# Altium schematic symbol library Minh_Lib.SchLib: 619 symbols (part 2 of 4) (continued)
## DS3231SN# (continued)
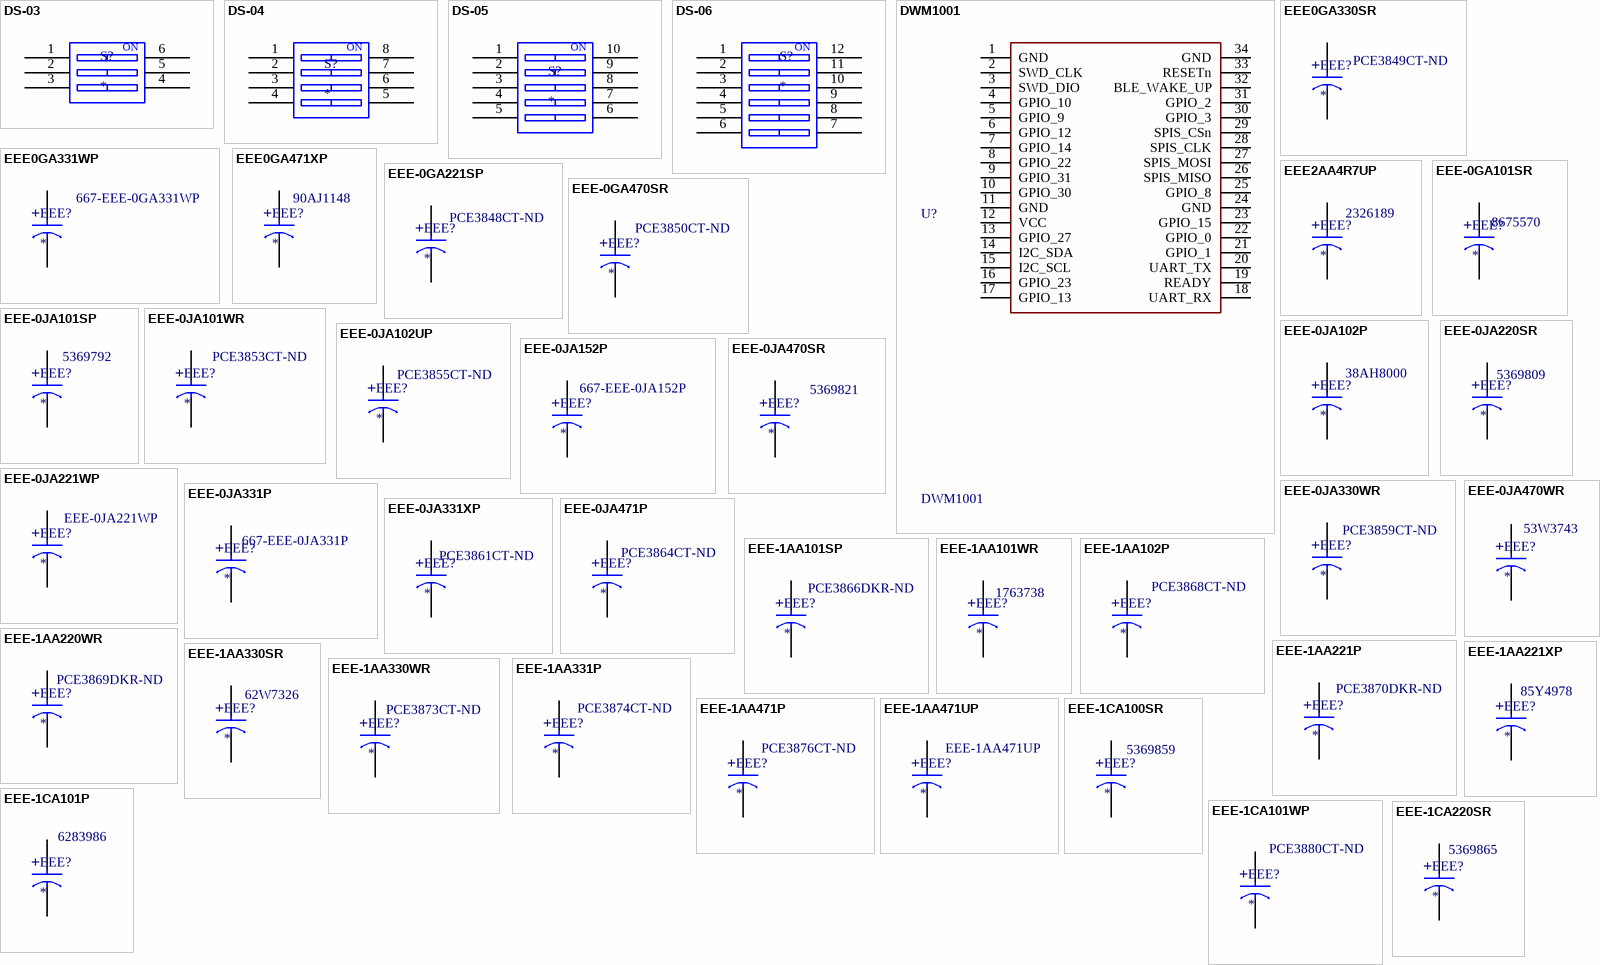
[diagram p7: symbols DS-03 to EEE-1CA220SR]

## DS-03
designator S?
footprint DS-03 (Dip Switch  - 3P)
pins: 1, 2, 3, 4, 5, 6
text: ON

## DS-04
designator S?
footprint DS-04 (Dip Switch  - 4P)
pins: 1, 2, 3, 4, 5, 6, 7, 8
text: ON

## DS-05
designator S?
footprint DS-05 (Dip Switch  - 5P)
pins: 1, 2, 3, 4, 5, 6, 7, 8, 9, 10
text: ON

## DS-06
designator S?
footprint DS-06
pins: 1, 2, 3, 4, 5, 6, 7, 8, 9, 10, 11, 12
text: ON

## DWM1001
designator U?
Local Supplier: x; Local Supplier Part Number: x; Local Supplier Link: x
footprint DWM1001 (DWM1001 MODULE)
pins: 1 GND, 2 SWD_CLK, 3 SWD_DIO, 4 GPIO_10, 5 GPIO_9, 6 GPIO_12, 7 GPIO_14, 8 GPIO_22, 9 GPIO_31, 10 GPIO_30, 11 GND, 12 VCC, 13 GPIO_27, 14 I2C_SDA, 15 I2C_SCL, 16 GPIO_23, 17 GPIO_13, 18 UART_RX, 19 READY, 20 UART_TX, 21 GPIO_1, 22 GPIO_0, 23 GPIO_15, 24 GND, 25 GPIO_8, 26 SPIS_MISO, 27 SPIS_MOSI, 28 SPIS_CLK, 29 SPIS_CSn, 30 GPIO_3, 31 GPIO_2, 32 BLE_WAKE_UP, 33 RESETn, 34 GND

## EEE0GA330SR
designator EEE?  Supplier Part Number 1: PCE3849CT-ND
Cap Aluminum 33uF 4V 20% (4 X 5.4mm) SMD 26mA 1000 hr 85°C T/R; Manufacturer: Panasonic; Manufacturer Part Number: EEE0GA330SR; Polarity: Polar; Life (Hours): 1000Hour; Supplier 1: Digi-Key; RoHS: Yes; Category: Aluminum Electrolytic Capacitors; Stock 1: 2632; Pricing 1: 1=0.33000, 10=0.22600, 50=0.15080, 100=0.12820, 500=0.09052, 1000=0.07921 (USD); Mount: Surface Mount; Case/Package: Radial; Min Operating Temperature: -40°C; Max Operating Temperature: 85°C; Capacitance: 33uF; Voltage Rating: 4V; Tolerance: 20%; Ripple Current: 26mA; Packaging: Tape and Reel; Package Quantity: 2000; Voltage Rating (DC): 4V; Termination: SMD/SMT; Series: Automotive, AEC-Q200, S; Construction: Cylindrical; Diameter: 4mm; Length: 5.5mm; Height: 5.4mm; Height - Seated (Max): 0.213inch; Radiation Hardening: No; Lead Free: Lead Free; RoHS Compliant: Yes; ComponentLink1URL: https://datasheet.ciiva.com/24024/aba0000ce2-40801-24024032.pdf?src-supplier=Mouser; ComponentLink1Description: https://datasheet.ciiva.com/24024/aba0000ce2-40801-24024032.pdf?src-supplier=Mouser; ComponentLink2URL: https://datasheet.ciiva.com/2985/aba0000ce2-2985008.pdf?src-supplier=Avnet; ComponentLink2Description: https://datasheet.ciiva.com/2985/aba0000ce2-2985008.pdf?src-supplier=Avnet; ComponentLink3URL: https://datasheet.ciiva.com/2985/aba0000ce2-2985009.pdf?src-supplier=Avnet; ComponentLink3Description: https://datasheet.ciiva.com/2985/aba0000ce2-2985009.pdf?src-supplier=Avnet; ComponentLink4URL: https://datasheet.ciiva.com/17536/aba0000ce2-17536806.pdf?src-supplier=Avnet+Europe; ComponentLink4Description: https://datasheet.ciiva.com/17536/aba0000ce2-17536806.pdf?src-supplier=Avnet+Europe
footprint CAPACITOR/ALU - SIZE B/SMD - 4X5.4 (CAPACITOR  -  ALUMINIUM - SIZE B / EEEFK - SMD)
pins: 1, 2
text: +

## EEE0GA331WP
designator EEE?  Supplier Part Number 1: 667-EEE-0GA331WP
Aluminum Electrolytic Capacitors, 4V, 330µF, -40¡C to +85¡C, RoHS; Manufacturer: Panasonic; Manufacturer Part Number: EEE0GA331WP; Capacitance: 330uF; Tolerance: 20%; Ripple Current: 80mA; Life (Hours): 1000Hour; Supplier 1: Mouser; RoHS: Yes; Category: Aluminum Electrolytic Capacitors; Stock 1: 1426; Pricing 1: 1=0.46000, 10=0.31800, 50=0.31800, 100=0.19100, 1000=0.12000, 10000=0.12000 (USD); Mount: Surface Mount; Case/Package: Radial; Min Operating Temperature: -40°C; Max Operating Temperature: 85°C; Packaging: Tape and Reel; Package Quantity: 1000; Voltage Rating: 4V; Termination: SMD/SMT; Voltage Rating (DC): 4V; Diameter: 6.3mm; Height: 5.4mm; Height - Seated (Max): 0.217inch; Radiation Hardening: No; RoHS Compliant: Yes; ComponentLink1URL: https://datasheet.ciiva.com/11680/aba0000ce2-11680695.pdf?src-supplier=Avnet; ComponentLink1Description: https://datasheet.ciiva.com/11680/aba0000ce2-11680695.pdf?src-supplier=Avnet; ComponentLink2URL: https://datasheet.ciiva.com/17535/aba0000ce2-17535964.pdf?src-supplier=Avnet+Europe; ComponentLink2Description: https://datasheet.ciiva.com/17535/aba0000ce2-17535964.pdf?src-supplier=Avnet+Europe
footprint CAPACITOR/ALU - SIZE D/SMD - 6.3X5.4 (CAPACITOR  -  ALUMINIUM - SIZE D / EEEFK - SMD)
pins: 1, 2
text: +

## EEE0GA471XP
designator EEE?  Supplier Part Number 1: 90AJ1148
Cap Aluminum 470uF 4V 20% (6.3 X 7.7mm) SMD 200mA 1000h 85°C T/R; Manufacturer: Panasonic; Manufacturer Part Number: EEE0GA471XP; Life (Hours): 1000Hour; Supplier 1: Newark; RoHS: Yes; Category: Aluminum Electrolytic Capacitors; Stock 1: 900; Pricing 1: 1000=0.16600, 5000=0.15100 (USD); Mount: Surface Mount; Case/Package: Radial; Contact Plating: Tin; Min Operating Temperature: -40°C; Max Operating Temperature: 85°C; Capacitance: 470uF; Tolerance: 20%; Package Quantity: 10000; Voltage Rating: 4V; Packaging: Tape and Reel; Ripple Current: 200mA; Voltage Rating (DC): 4V; Termination: SMD/SMT; Series: S; Construction: Cylindrical; Diameter: 6.3mm; Length: 8mm; Height: 8mm; Height - Seated (Max): 0.315inch; Radiation Hardening: No; ComponentLink1URL: https://datasheet.ciiva.com/11680/aba0000ce2-11680280.pdf?src-supplier=Avnet; ComponentLink1Description: https://datasheet.ciiva.com/11680/aba0000ce2-11680280.pdf?src-supplier=Avnet; ComponentLink2URL: https://datasheet.ciiva.com/17530/aba0000ce2-17530359.pdf?src-supplier=Avnet+Europe; ComponentLink2Description: https://datasheet.ciiva.com/17530/aba0000ce2-17530359.pdf?src-supplier=Avnet+Europe
footprint CAPACITOR/ALU - SIZE D8/SMD - 6.3X7.7 (CAPACITOR  -  ALUMINIUM - SIZE D8 / EEEFK - SMD)
pins: 1, 2
text: +

## EEE2AA4R7UP
designator EEE?  Supplier Part Number 1: 2326189
Cap Aluminum 4.7uF 100V 20% (8 X 6.2mm) SMD 50mA 2000 hr 85°C T/R; Manufacturer: Panasonic; Manufacturer Part Number: EEE2AA4R7UP; Dielectric Material: Aluminium; Leakage Current: 4.7uA; Life (Hours): 2000Hour; Supplier 1: Farnell; RoHS: Yes; Category: Aluminum Electrolytic Capacitors; Pricing 1: 1=0.28500, 50=0.21000, 100=0.15200, 500=0.12600, 1000=0.12200 (GBP); Mount: Surface Mount,PCB; Case/Package: Radial; Contact Plating: Tin; Min Operating Temperature: -40°C; Max Operating Temperature: 85°C; Capacitance: 4.7uF; Voltage Rating: 100V; Tolerance: 20%; Ripple Current: 50mA; Packaging: Tape and Reel; Package Quantity: 1; Voltage Rating (DC): 100V; Ripple Current (AC): 50mA; Termination: SMD/SMT; Voltage: 100V; Series: S; Construction: Cylindrical; Diameter: 8mm; Length: 6.2mm; Height: 6.2mm; Height - Seated (Max): 0.244inch; Radiation Hardening: No; REACH SVHC: Unknown; RoHS Compliant: Yes; ComponentLink1URL: https://datasheet.ciiva.com/43470/aba0000ce2-43470703.pdf?src-supplier=Farnell; ComponentLink1Description: https://datasheet.ciiva.com/43470/aba0000ce2-43470703.pdf?src-supplier=Farnell; ComponentLink2URL: https://datasheet.ciiva.com/46378/aba0000ce2-46378327.pdf?src-supplier=Element14; ComponentLink2Description: https://datasheet.ciiva.com/46378/aba0000ce2-46378327.pdf?src-supplier=Element14; ComponentLink3URL: https://datasheet.ciiva.com/31414/aba0000ce2-31414712.pdf?src-supplier=Farnell; ComponentLink3Description: https://datasheet.ciiva.com/31414/aba0000ce2-31414712.pdf?src-supplier=Farnell; ComponentLink4URL: https://datasheet.ciiva.com/46374/aba0000ce2-46374412.pdf?src-supplier=Element14; ComponentLink4Description: https://datasheet.ciiva.com/46374/aba0000ce2-46374412.pdf?src-supplier=Element14; ComponentLink5URL: https://datasheet.ciiva.com/14600/70255710-14600598.pdf?src-supplier=Allied+Electronics; ComponentLink5Description: https://datasheet.ciiva.com/14600/70255710-14600598.pdf?src-supplier=Allied+Electronics; ComponentLink6URL: https://datasheet.ciiva.com/14597/70255710-14597336.pdf?src-supplier=Allied+Electronics; ComponentLink6Description: https://datasheet.ciiva.com/14597/70255710-14597336.pdf?src-supplier=Allied+Electronics; ComponentLink7URL: https://datasheet.ciiva.com/2985/aba0000ce2-2985247.pdf?src-supplier=Avnet; ComponentLink7Description: https://datasheet.ciiva.com/2985/aba0000ce2-2985247.pdf?src-supplier=Avnet; ComponentLink8URL: https://datasheet.ciiva.com/16432/aba0000ce2-16432893.pdf?src-supplier=Future+Electronics; ComponentLink8Description: https://datasheet.ciiva.com/16432/aba0000ce2-16432893.pdf?src-supplier=Future+Electronics; ComponentLink9URL: https://datasheet.ciiva.com/17536/aba0000ce2-17536378.pdf?src-supplier=Avnet+Europe; ComponentLink9Description: https://datasheet.ciiva.com/17536/aba0000ce2-17536378.pdf?src-supplier=Avnet+Europe
footprint CAPACITOR/ALU - SIZE E/SMD - 8X6.2 (CAPACITOR  -  ALUMINIUM - SIZE E / EEEFK - SMD)
pins: 1, 2
text: +

## EEE-0GA101SR
designator EEE?  Supplier Part Number 1: 8675570
Cap Aluminum 100uF 4V 20% (5 X 5.4mm) SMD 61mA 1000h 85°C T/R; Manufacturer: Panasonic; Manufacturer Part Number: EEE-0GA101SR; Dielectric Material: Aluminium; Life (Hours): 1000Hour; Leakage Current: 4uA; Supplier 1: RSComponents; RoHS: Yes; Category: Aluminum Electrolytic Capacitors; Stock 1: 425; Pricing 1: 25=0.24000, 125=0.13900, 250=0.13200, 500=0.10100, 1000=0.08900, 25=0.17300, 125=0.10000, 250=0.09500, 500=0.07300, 1000=0.06400 (USD); Mount: Surface Mount,PCB; Case/Package: Radial; Contact Plating: Tin; Min Operating Temperature: -40°C; Max Operating Temperature: 85°C; Capacitance: 100uF; Packaging: Tape and Reel; Ripple Current: 61mA; Tolerance: 20%; Package Quantity: 1; Voltage Rating: 4V; Voltage Rating (DC): 4V; Ripple Current (AC): 61mA; Termination: SMD/SMT; Voltage: 4V; Series: S; Construction: Cylindrical; Diameter: 5mm; Length: 5.5mm; Height: 5.4mm; Height - Seated (Max): 0.213inch; Radiation Hardening: No; REACH SVHC: No SVHC; Lead Free: Lead Free; RoHS Compliant: Yes; ComponentLink1URL: https://datasheet.ciiva.com/43470/aba0000ce2-43470607.pdf?src-supplier=Farnell; ComponentLink1Description: https://datasheet.ciiva.com/43470/aba0000ce2-43470607.pdf?src-supplier=Farnell; ComponentLink2URL: https://datasheet.ciiva.com/46378/aba0000ce2-46378279.pdf?src-supplier=Element14; ComponentLink2Description: https://datasheet.ciiva.com/46378/aba0000ce2-46378279.pdf?src-supplier=Element14; ComponentLink3URL: https://datasheet.ciiva.com/31414/aba0000ce2-31414615.pdf?src-supplier=Farnell; ComponentLink3Description: https://datasheet.ciiva.com/31414/aba0000ce2-31414615.pdf?src-supplier=Farnell; ComponentLink4URL: https://datasheet.ciiva.com/46374/aba0000ce2-46374363.pdf?src-supplier=Element14; ComponentLink4Description: https://datasheet.ciiva.com/46374/aba0000ce2-46374363.pdf?src-supplier=Element14; ComponentLink5URL: https://datasheet.ciiva.com/14598/70255710-14598046.pdf?src-supplier=Allied+Electronics; ComponentLink5Description: https://datasheet.ciiva.com/14598/70255710-14598046.pdf?src-supplier=Allied+Electronics; ComponentLink6URL: https://datasheet.ciiva.com/14593/70255710-14593855.pdf?src-supplier=Allied+Electronics; ComponentLink6Description: https://datasheet.ciiva.com/14593/70255710-14593855.pdf?src-supplier=Allied+Electronics; ComponentLink7URL: https://datasheet.ciiva.com/30090/11aba0000ce2-30090359.pdf?src-supplier=Onlinecomponents.com; ComponentLink7Description: https://datasheet.ciiva.com/30090/11aba0000ce2-30090359.pdf?src-supplier=Onlinecomponents.com; ComponentLink8URL: https://datasheet.ciiva.com/17536/aba0000ce2-17536207.pdf?src-supplier=Avnet+Europe; ComponentLink8Description: https://datasheet.ciiva.com/17536/aba0000ce2-17536207.pdf?src-supplier=Avnet+Europe
footprint CAPACITOR/ALU - SIZE C/SMD - 5X5.4 (CAPACITOR  -  ALUMINIUM - SIZE C / EEEFK - SMD)
pins: 1, 2
text: +

## EEE-0GA221SP
designator EEE?  Supplier Part Number 1: PCE3848CT-ND
Aluminum Electrolytic Capacitor, 220UF, 4V, 20%, SMD, Full Reel; Manufacturer: Panasonic; Manufacturer Part Number: EEE-0GA221SP; Dielectric Material: Aluminium; Ripple Current: 82mA; Life (Hours): 1000Hour; Leakage Current: 8.8uA; Supplier 1: Digi-Key; RoHS: Yes; Category: Aluminum Electrolytic Capacitors; Stock 1: 170; Pricing 1: 1=0.38000, 10=0.26400, 50=0.18520, 100=0.15870, 500=0.11902 (USD); Mount: Surface Mount,PCB; Case/Package: Radial; Contact Plating: Tin; Min Operating Temperature: -40°C; Max Operating Temperature: 85°C; Capacitance: 220uF; Tolerance: 20%; Packaging: Tape and Reel; Voltage Rating: 4V; Voltage Rating (DC): 4V; Package Quantity: 1; Termination: SMD/SMT; Ripple Current (AC): 82mA; Voltage: 4V; Series: S; Construction: Cylindrical; Diameter: 6.3mm; Length: 5.5mm; Height: 5.4mm; Height - Seated (Max): 0.213inch; Radiation Hardening: No; Lead Free: Lead Free; REACH SVHC: Unknown; RoHS Compliant: Yes; ComponentLink1URL: https://datasheet.ciiva.com/46378/aba0000ce2-46378278.pdf?src-supplier=Element14; ComponentLink1Description: https://datasheet.ciiva.com/46378/aba0000ce2-46378278.pdf?src-supplier=Element14; ComponentLink2URL: https://datasheet.ciiva.com/31414/aba0000ce2-31414616.pdf?src-supplier=Farnell; ComponentLink2Description: https://datasheet.ciiva.com/31414/aba0000ce2-31414616.pdf?src-supplier=Farnell; ComponentLink3URL: https://datasheet.ciiva.com/46374/aba0000ce2-46374362.pdf?src-supplier=Element14; ComponentLink3Description: https://datasheet.ciiva.com/46374/aba0000ce2-46374362.pdf?src-supplier=Element14; ComponentLink4URL: https://datasheet.ciiva.com/24028/aba0000ce2-40801-24028140.pdf?src-supplier=Mouser; ComponentLink4Description: https://datasheet.ciiva.com/24028/aba0000ce2-40801-24028140.pdf?src-supplier=Mouser; ComponentLink5URL: https://datasheet.ciiva.com/14603/70255710-14603722.pdf?src-supplier=Allied+Electronics; ComponentLink5Description: https://datasheet.ciiva.com/14603/70255710-14603722.pdf?src-supplier=Allied+Electronics; ComponentLink6URL: https://datasheet.ciiva.com/14595/70255710-14595805.pdf?src-supplier=Allied+Electronics; ComponentLink6Description: https://datasheet.ciiva.com/14595/70255710-14595805.pdf?src-supplier=Allied+Electronics; ComponentLink7URL: https://datasheet.ciiva.com/2985/aba0000ce2-2985006.pdf?src-supplier=Avnet; ComponentLink7Description: https://datasheet.ciiva.com/2985/aba0000ce2-2985006.pdf?src-supplier=Avnet; ComponentLink8URL: https://datasheet.ciiva.com/2985/aba0000ce2-2985007.pdf?src-supplier=Avnet; ComponentLink8Description: https://datasheet.ciiva.com/2985/aba0000ce2-2985007.pdf?src-supplier=Avnet; ComponentLink9URL: https://datasheet.ciiva.com/30175/11aba0000ce2-30175965.pdf?src-supplier=Onlinecomponents.com; ComponentLink9Description: https://datasheet.ciiva.com/30175/11aba0000ce2-30175965.pdf?src-supplier=Onlinecomponents.com; ComponentLink10URL: https://datasheet.ciiva.com/17535/aba0000ce2-17535941.pdf?src-supplier=Avnet+Europe; ComponentLink10Description: https://datasheet.ciiva.com/17535/aba0000ce2-17535941.pdf?src-supplier=Avnet+Europe
footprint CAPACITOR/ALU - SIZE D/SMD - 6.3X5.4 (CAPACITOR  -  ALUMINIUM - SIZE D / EEEFK - SMD)
pins: 1, 2
text: +

## EEE-0GA470SR
designator EEE?  Supplier Part Number 1: PCE3850CT-ND
Cap Aluminum 47uF 4V 20% (4 X 5.4mm) SMD 34mA 1000 hr 85°C T/R; Manufacturer: Panasonic; Manufacturer Part Number: EEE-0GA470SR; Polarity: Polar; Leakage Current: 3uA; Life (Hours): 1000Hour; Supplier 1: Digi-Key; RoHS: Yes; Category: Aluminum Electrolytic Capacitors; Stock 1: 1429; Pricing 1: 1=0.33000, 10=0.22600, 50=0.15080, 100=0.12820, 500=0.09052, 1000=0.07921 (USD); Mount: Surface Mount,PCB; Case/Package: Radial; Min Operating Temperature: -40°C; Max Operating Temperature: 85°C; Packaging: Tape and Reel; Capacitance: 47uF; Tolerance: 20%; Ripple Current: 34mA; Voltage Rating: 4V; Ripple Current (AC): 34mA; Package Quantity: 2000; Voltage Rating (DC): 4V; Termination: SMD/SMT; Voltage: 4V; Series: Automotive, AEC-Q200, S; Construction: Cylindrical; Diameter: 4mm; Length: 5.5mm; Height: 5.4mm; Height - Seated (Max): 0.213inch; Radiation Hardening: No; REACH SVHC: No SVHC; Lead Free: Lead Free; RoHS Compliant: Yes; ComponentLink1URL: https://datasheet.ciiva.com/24024/aba0000ce2-40801-24024838.pdf?src-supplier=Mouser; ComponentLink1Description: https://datasheet.ciiva.com/24024/aba0000ce2-40801-24024838.pdf?src-supplier=Mouser; ComponentLink2URL: https://datasheet.ciiva.com/14596/70255710-14596552.pdf?src-supplier=Allied+Electronics; ComponentLink2Description: https://datasheet.ciiva.com/14596/70255710-14596552.pdf?src-supplier=Allied+Electronics; ComponentLink3URL: https://datasheet.ciiva.com/14599/70255710-14599785.pdf?src-supplier=Allied+Electronics; ComponentLink3Description: https://datasheet.ciiva.com/14599/70255710-14599785.pdf?src-supplier=Allied+Electronics; ComponentLink4URL: https://datasheet.ciiva.com/31414/aba0000ce2-31414617.pdf?src-supplier=Farnell; ComponentLink4Description: https://datasheet.ciiva.com/31414/aba0000ce2-31414617.pdf?src-supplier=Farnell; ComponentLink5URL: https://datasheet.ciiva.com/30059/11aba0000ce2-30059598.pdf?src-supplier=Onlinecomponents.com; ComponentLink5Description: https://datasheet.ciiva.com/30059/11aba0000ce2-30059598.pdf?src-supplier=Onlinecomponents.com; ComponentLink6URL: https://datasheet.ciiva.com/46374/aba0000ce2-46374361.pdf?src-supplier=Element14; ComponentLink6Description: https://datasheet.ciiva.com/46374/aba0000ce2-46374361.pdf?src-supplier=Element14
footprint CAPACITOR/ALU - SIZE B/SMD - 4X5.4 (CAPACITOR  -  ALUMINIUM - SIZE B / EEEFK - SMD)
pins: 1, 2
text: +

## EEE-0JA101SP
designator EEE?  Supplier Part Number 1: 5369792
Cap Aluminum 100uF 6.3V 20% (6.3 X 5.4mm) SMD 71mA 2000 hr 85C T/R; Manufacturer: Panasonic; Manufacturer Part Number: EEE-0JA101SP; Dielectric Material: Aluminium; Life (Hours): 2000Hour; Leakage Current: 3uA; Lead Length: 2.6mm; Supplier 1: RSComponents; RoHS: Yes; Category: Aluminum Electrolytic Capacitors; Stock 1: 365; Pricing 1: 5=0.36000, 50=0.18600, 250=0.12500, 500=0.11600, 2500=0.08900, 5=0.26000, 50=0.13400, 250=0.09000, 500=0.08400, 2500=0.06400 (USD); Mount: Surface Mount,PCB; Case/Package: Radial; Number of Pins: 2; Contact Plating: Tin; Min Operating Temperature: -40°C; Max Operating Temperature: 85°C; Capacitance: 100uF; Voltage Rating: 6.3V; Ripple Current (AC): 71mA; Packaging: Tape and Reel; Ripple Current: 71mA; Tolerance: 20%; Voltage Rating (DC): 6.3V; Package Quantity: 1; Termination: SMD/SMT; Voltage: 6.3V; Features: General Purpose; Series: S; Construction: Cylindrical; Diameter: 6.3mm; Length: 5.5mm; Width: 6.6mm; Height: 5.4mm; Height - Seated (Max): 0.213inch; Lead Pitch: 2.2mm; Radiation Hardening: No; REACH SVHC: No SVHC; Lead Free: Lead Free; RoHS Compliant: Yes; ComponentLink1URL: https://datasheet.ciiva.com/11779/0900766b8078636e-11779744.pdf?src-supplier=RSComponents; ComponentLink1Description: https://datasheet.ciiva.com/11779/0900766b8078636e-11779744.pdf?src-supplier=RSComponents; ComponentLink2URL: https://datasheet.ciiva.com/24070/aba0000ce2-40801-24070230.pdf?src-supplier=Mouser; ComponentLink2Description: https://datasheet.ciiva.com/24070/aba0000ce2-40801-24070230.pdf?src-supplier=Mouser; ComponentLink3URL: https://datasheet.ciiva.com/14610/70255710-14610022.pdf?src-supplier=Allied+Electronics; ComponentLink3Description: https://datasheet.ciiva.com/14610/70255710-14610022.pdf?src-supplier=Allied+Electronics; ComponentLink4URL: https://datasheet.ciiva.com/14595/70255710-14595757.pdf?src-supplier=Allied+Electronics; ComponentLink4Description: https://datasheet.ciiva.com/14595/70255710-14595757.pdf?src-supplier=Allied+Electronics; ComponentLink5URL: https://datasheet.ciiva.com/43485/aba0000ce2-43485605.pdf?src-supplier=Farnell; ComponentLink5Description: https://datasheet.ciiva.com/43485/aba0000ce2-43485605.pdf?src-supplier=Farnell; ComponentLink6URL: https://datasheet.ciiva.com/46387/aba0000ce2-46387964.pdf?src-supplier=Element14; ComponentLink6Description: https://datasheet.ciiva.com/46387/aba0000ce2-46387964.pdf?src-supplier=Element14; ComponentLink7URL: https://datasheet.ciiva.com/6134/aba0000ce2-6134361.pdf?src-supplier=Farnell; ComponentLink7Description: https://datasheet.ciiva.com/6134/aba0000ce2-6134361.pdf?src-supplier=Farnell; ComponentLink8URL: https://datasheet.ciiva.com/46376/aba0000ce2-46376375.pdf?src-supplier=Element14; ComponentLink8Description: https://datasheet.ciiva.com/46376/aba0000ce2-46376375.pdf?src-supplier=Element14; ComponentLink9URL: https://datasheet.ciiva.com/2983/aba0000ce2-2983902.pdf?src-supplier=Avnet; ComponentLink9Description: https://datasheet.ciiva.com/2983/aba0000ce2-2983902.pdf?src-supplier=Avnet; ComponentLink10URL: https://datasheet.ciiva.com/16397/aba0000ce2-16397066.pdf?src-supplier=Future+Electronics; ComponentLink10Description: https://datasheet.ciiva.com/16397/aba0000ce2-16397066.pdf?src-supplier=Future+Electronics; ComponentLink11URL: https://datasheet.ciiva.com/30226/11aba0000ce2-30226184.pdf?src-supplier=Onlinecomponents.com; ComponentLink11Description: https://datasheet.ciiva.com/30226/11aba0000ce2-30226184.pdf?src-supplier=Onlinecomponents.com; ComponentLink12URL: https://datasheet.ciiva.com/15165/getdatasheetpartid-73778-15165850.pdf?src-supplier=Verical; ComponentLink12Description: https://datasheet.ciiva.com/15165/getdatasheetpartid-73778-15165850.pdf?src-supplier=Verical; ComponentLink13URL: https://datasheet.ciiva.com/17353/aba0000ce2-17353295.pdf?src-supplier=Avnet+Europe; ComponentLink13Description: https://datasheet.ciiva.com/17353/aba0000ce2-17353295.pdf?src-supplier=Avnet+Europe; ComponentLink14URL: https://datasheet.ciiva.com/16539/aba0000ce2-16539929.pdf?src-supplier=Avnet+Asia; ComponentLink14Description: https://datasheet.ciiva.com/16539/aba0000ce2-16539929.pdf?src-supplier=Avnet+Asia
footprint CAPACITOR/ALU - SIZE D/SMD - 6.3X5.4 (CAPACITOR  -  ALUMINIUM - SIZE D / EEEFK - SMD)
pins: 1, 2
text: +

## EEE-0JA101WR
designator EEE?  Supplier Part Number 1: PCE3853CT-ND
Cap Aluminum 100uF 6.3V 20% (5 X 5.4mm) SMD 47mA 1000 hr 85°C T/R; Manufacturer: Panasonic; Manufacturer Part Number: EEE-0JA101WR; Life (Hours): 1000Hour; Supplier 1: Digi-Key; RoHS: Yes; Category: Aluminum Electrolytic Capacitors; Stock 1: 143; Pricing 1: 1=0.35000, 10=0.24400, 50=0.17060, 100=0.14630, 500=0.10972 (USD); Mount: Surface Mount,PCB; Case/Package: Radial; Contact Plating: Tin; Min Operating Temperature: -40°C; Max Operating Temperature: 85°C; Ripple Current: 47mA; Tolerance: 20%; Capacitance: 100uF; Voltage Rating: 6.3V; Packaging: Tape and Reel; Ripple Current (AC): 47mA; Package Quantity: 1; Voltage Rating (DC): 6.3V; Termination: SMD/SMT; Series: S; Construction: Cylindrical; Diameter: 5mm; Length: 5.5mm; Height: 5.4mm; Height - Seated (Max): 0.213inch; Radiation Hardening: No; REACH SVHC: Unknown; Lead Free: Lead Free; RoHS Compliant: Yes; ComponentLink1URL: https://datasheet.ciiva.com/24068/aba0000ce2-40801-24068040.pdf?src-supplier=Mouser; ComponentLink1Description: https://datasheet.ciiva.com/24068/aba0000ce2-40801-24068040.pdf?src-supplier=Mouser; ComponentLink2URL: https://datasheet.ciiva.com/14606/70255710-14606987.pdf?src-supplier=Allied+Electronics; ComponentLink2Description: https://datasheet.ciiva.com/14606/70255710-14606987.pdf?src-supplier=Allied+Electronics; ComponentLink3URL: https://datasheet.ciiva.com/14596/70255710-14596279.pdf?src-supplier=Allied+Electronics; ComponentLink3Description: https://datasheet.ciiva.com/14596/70255710-14596279.pdf?src-supplier=Allied+Electronics; ComponentLink4URL: https://datasheet.ciiva.com/2985/aba0000ce2-2985015.pdf?src-supplier=Avnet; ComponentLink4Description: https://datasheet.ciiva.com/2985/aba0000ce2-2985015.pdf?src-supplier=Avnet; ComponentLink5URL: https://datasheet.ciiva.com/16397/aba0000ce2-16397130.pdf?src-supplier=Future+Electronics; ComponentLink5Description: https://datasheet.ciiva.com/16397/aba0000ce2-16397130.pdf?src-supplier=Future+Electronics; ComponentLink6URL: https://datasheet.ciiva.com/30201/11aba0000ce2-30201865.pdf?src-supplier=Onlinecomponents.com; ComponentLink6Description: https://datasheet.ciiva.com/30201/11aba0000ce2-30201865.pdf?src-supplier=Onlinecomponents.com
footprint CAPACITOR/ALU - SIZE C/SMD - 5X5.4 (CAPACITOR  -  ALUMINIUM - SIZE C / EEEFK - SMD)
pins: 1, 2
text: +

## EEE-0JA102P
designator EEE?  Supplier Part Number 1: 38AH8000
Aluminum Electrolytic Capacitor, 1000UF, 6.3V, 20%, SMD, Full Reel; Manufacturer: Panasonic; Manufacturer Part Number: EEE-0JA102P; Capacitance: 1mF; Ripple Current: 700mA; Life (Hours): 2000Hour; Leakage Current: 3uA; Supplier 1: Newark; RoHS: Yes; Category: Aluminum Electrolytic Capacitors; Stock 1: 500; Pricing 1: 1=0.22400, 500=0.22400, 5000=0.22000, 10000=0.20400, 20000=0.19300, 30000=0.18200, 50000=0.17400 (USD); Mount: Surface Mount,PCB; Case/Package: Radial; Contact Plating: Tin; Min Operating Temperature: -40°C; Max Operating Temperature: 85°C; Tolerance: 20%; Voltage Rating: 6.3V; Packaging: Tape and Reel; Package Quantity: 1; Ripple Current (AC): 700mA; Voltage Rating (DC): 6.3V; Termination: SMD/SMT; Voltage: 6.3V; Series: S; Construction: Cylindrical; Diameter: 10mm; Length: 10.5mm; Height: 10.2mm; Height - Seated (Max): 0.402inch; Radiation Hardening: No; REACH SVHC: Unknown; Lead Free: Lead Free; RoHS Compliant: Yes; ComponentLink1URL: https://datasheet.ciiva.com/91/aba0000ce2-91588.pdf?src-supplier=Digi-Key; ComponentLink1Description: https://datasheet.ciiva.com/91/aba0000ce2-91588.pdf?src-supplier=Digi-Key; ComponentLink2URL: https://datasheet.ciiva.com/91/aba0000ce2-91589.pdf?src-supplier=Digi-Key; ComponentLink2Description: https://datasheet.ciiva.com/91/aba0000ce2-91589.pdf?src-supplier=Digi-Key; ComponentLink3URL: https://datasheet.ciiva.com/15166/getdatasheetpartid-178567-15166267.pdf?src-supplier=Verical; ComponentLink3Description: https://datasheet.ciiva.com/15166/getdatasheetpartid-178567-15166267.pdf?src-supplier=Verical; ComponentLink4URL: https://datasheet.ciiva.com/24228/aba0000ce2-40801-24228357.pdf?src-supplier=Mouser; ComponentLink4Description: https://datasheet.ciiva.com/24228/aba0000ce2-40801-24228357.pdf?src-supplier=Mouser; ComponentLink5URL: https://datasheet.ciiva.com/91/aba0000ce2-91590.pdf?src-supplier=Digi-Key; ComponentLink5Description: https://datasheet.ciiva.com/91/aba0000ce2-91590.pdf?src-supplier=Digi-Key; ComponentLink6URL: https://datasheet.ciiva.com/14603/70255710-14603882.pdf?src-supplier=Allied+Electronics; ComponentLink6Description: https://datasheet.ciiva.com/14603/70255710-14603882.pdf?src-supplier=Allied+Electronics; ComponentLink7URL: https://datasheet.ciiva.com/14600/70255710-14600635.pdf?src-supplier=Allied+Electronics; ComponentLink7Description: https://datasheet.ciiva.com/14600/70255710-14600635.pdf?src-supplier=Allied+Electronics; ComponentLink8URL: https://datasheet.ciiva.com/16210/aba0000ce2-16210061.pdf?src-supplier=Future+Electronics; ComponentLink8Description: https://datasheet.ciiva.com/16210/aba0000ce2-16210061.pdf?src-supplier=Future+Electronics; ComponentLink9URL: https://datasheet.ciiva.com/2985/aba0000ce2-2985019.pdf?src-supplier=Avnet; ComponentLink9Description: https://datasheet.ciiva.com/2985/aba0000ce2-2985019.pdf?src-supplier=Avnet
footprint CAPACITOR/ALU - SIZE G/SMD - 10X10.2 (CAPACITOR  -  ALUMINIUM - SIZE G / EEEFK - SMD)
pins: 1, 2
text: +

## EEE-0JA102UP
designator EEE?  Supplier Part Number 1: PCE3855CT-ND
Cap Aluminum 1000uF 6.3V 20% (8 X 10.2mm) SMD 500mA 2000 hr 85°C T/R; Manufacturer: Panasonic; Manufacturer Part Number: EEE-0JA102UP; Capacitance: 1mF; Life (Hours): 2000Hour; Supplier 1: Digi-Key; RoHS: Yes; Category: Aluminum Electrolytic Capacitors; Pricing 1: 1=0.71000, 10=0.49900, 50=0.37720, 100=0.32850 (USD); Mount: Surface Mount,PCB; Case/Package: Radial; Contact Plating: Tin; Min Operating Temperature: -40°C; Max Operating Temperature: 85°C; Voltage Rating: 6.3V; Tolerance: 20%; Ripple Current: 500mA; Packaging: Tape and Reel; Package Quantity: 1; Voltage Rating (DC): 6.3V; Termination: SMD/SMT; Ripple Current (AC): 500mA; Series: S; Construction: Cylindrical; Diameter: 8mm; Length: 10.5mm; Height: 10.2mm; Height - Seated (Max): 0.402inch; Radiation Hardening: No; Lead Free: Lead Free; REACH SVHC: Unknown; RoHS Compliant: Yes; ComponentLink1URL: https://datasheet.ciiva.com/24027/aba0000ce2-40801-24027035.pdf?src-supplier=Mouser; ComponentLink1Description: https://datasheet.ciiva.com/24027/aba0000ce2-40801-24027035.pdf?src-supplier=Mouser; ComponentLink2URL: https://datasheet.ciiva.com/14596/70255710-14596862.pdf?src-supplier=Allied+Electronics; ComponentLink2Description: https://datasheet.ciiva.com/14596/70255710-14596862.pdf?src-supplier=Allied+Electronics; ComponentLink3URL: https://datasheet.ciiva.com/2985/aba0000ce2-2985020.pdf?src-supplier=Avnet; ComponentLink3Description: https://datasheet.ciiva.com/2985/aba0000ce2-2985020.pdf?src-supplier=Avnet; ComponentLink4URL: https://datasheet.ciiva.com/16397/aba0000ce2-16397454.pdf?src-supplier=Future+Electronics; ComponentLink4Description: https://datasheet.ciiva.com/16397/aba0000ce2-16397454.pdf?src-supplier=Future+Electronics; ComponentLink5URL: https://datasheet.ciiva.com/15166/getdatasheetpartid-178566-15166266.pdf?src-supplier=Verical; ComponentLink5Description: https://datasheet.ciiva.com/15166/getdatasheetpartid-178566-15166266.pdf?src-supplier=Verical; ComponentLink6URL: https://datasheet.ciiva.com/30195/11aba0000ce2-30195737.pdf?src-supplier=Onlinecomponents.com; ComponentLink6Description: https://datasheet.ciiva.com/30195/11aba0000ce2-30195737.pdf?src-supplier=Onlinecomponents.com; ComponentLink7URL: https://datasheet.ciiva.com/17534/aba0000ce2-17534251.pdf?src-supplier=Avnet+Europe; ComponentLink7Description: https://datasheet.ciiva.com/17534/aba0000ce2-17534251.pdf?src-supplier=Avnet+Europe
footprint CAPACITOR/ALU - SIZE F/SMD - 8X10.2 (CAPACITOR  -  ALUMINIUM - SIZE F / EEEFK - SMD)
pins: 1, 2
text: +

## EEE-0JA152P
designator EEE?  Supplier Part Number 1: 667-EEE-0JA152P
Cap Aluminum 1500uF 6.3V 20% (10 X 10.2mm) SMD 750mA 2000 hr 85°C T/R; Manufacturer: Panasonic; Manufacturer Part Number: EEE-0JA152P; Capacitance: 1.5mF; Polarity: Polar; Life (Hours): 2000Hour; Supplier 1: Mouser; RoHS: Yes; Category: Aluminum Electrolytic Capacitors; Stock 1: 3; Pricing 1: 1=0.83000, 10=0.59100, 50=0.59100, 100=0.39000, 1000=0.28800, 10000=0.28800 (USD); Mount: Surface Mount,PCB; Case/Package: Radial; Contact Plating: Tin; Min Operating Temperature: -40°C; Max Operating Temperature: 85°C; Tolerance: 20%; Voltage Rating (DC): 6.3V; Packaging: Tape and Reel; Voltage Rating: 6.3V; Package Quantity: 500; Termination: SMD/SMT; Ripple Current (AC): 750mA; Ripple Current: 750mA; Series: S; Construction: Cylindrical; Diameter: 10mm; Length: 10.5mm; Height: 10.2mm; Height - Seated (Max): 0.402inch; Radiation Hardening: No; Lead Free: Lead Free; REACH SVHC: Unknown; RoHS Compliant: Yes; ComponentLink1URL: https://datasheet.ciiva.com/3773/41790760s9936654n1386-3773450.pdf?src-supplier=Arrow+Electronics; ComponentLink1Description: https://datasheet.ciiva.com/3773/41790760s9936654n1386-3773450.pdf?src-supplier=Arrow+Electronics; ComponentLink2URL: https://datasheet.ciiva.com/16432/aba0000ce2-16432902.pdf?src-supplier=Future+Electronics; ComponentLink2Description: https://datasheet.ciiva.com/16432/aba0000ce2-16432902.pdf?src-supplier=Future+Electronics; ComponentLink3URL: https://datasheet.ciiva.com/17533/aba0000ce2-17533815.pdf?src-supplier=Avnet+Europe; ComponentLink3Description: https://datasheet.ciiva.com/17533/aba0000ce2-17533815.pdf?src-supplier=Avnet+Europe; ComponentLink4URL: https://datasheet.ciiva.com/46374/aba0000ce2-46374359.pdf?src-supplier=Element14; ComponentLink4Description: https://datasheet.ciiva.com/46374/aba0000ce2-46374359.pdf?src-supplier=Element14; ComponentLink5URL: https://datasheet.ciiva.com/11679/aba0000ce2-11679432.pdf?src-supplier=Avnet; ComponentLink5Description: https://datasheet.ciiva.com/11679/aba0000ce2-11679432.pdf?src-supplier=Avnet; ComponentLink6URL: https://datasheet.ciiva.com/14606/70255710-14606522.pdf?src-supplier=Allied+Electronics; ComponentLink6Description: https://datasheet.ciiva.com/14606/70255710-14606522.pdf?src-supplier=Allied+Electronics; ComponentLink7URL: https://datasheet.ciiva.com/31414/aba0000ce2-31414619.pdf?src-supplier=Farnell; ComponentLink7Description: https://datasheet.ciiva.com/31414/aba0000ce2-31414619.pdf?src-supplier=Farnell; ComponentLink8URL: https://datasheet.ciiva.com/30064/11aba0000ce2-30064780.pdf?src-supplier=Onlinecomponents.com; ComponentLink8Description: https://datasheet.ciiva.com/30064/11aba0000ce2-30064780.pdf?src-supplier=Onlinecomponents.com
footprint CAPACITOR/ALU - SIZE G/SMD - 10X10.2 (CAPACITOR  -  ALUMINIUM - SIZE G / EEEFK - SMD)
pins: 1, 2
text: +

## EEE-0JA220SR
designator EEE?  Supplier Part Number 1: 5369809
Cap Aluminum 22uF 6.3V 20% (4 X 5.4mm) SMD 29mA 2000 hr 85°C T/R; Manufacturer: Panasonic; Manufacturer Part Number: EEE-0JA220SR; Dielectric Material: Aluminium; Polarity: Polar; Life (Hours): 2000Hour; Leakage Current: 3uA; Lead Length: 1.8mm; Supplier 1: RSComponents; RoHS: Yes; Category: Aluminum Electrolytic Capacitors; Stock 1: 380; Pricing 1: 5=0.31300, 25=0.31000, 375=0.12700, 1250=0.08600, 5=0.22600, 25=0.22400, 375=0.09200, 1250=0.06200 (USD); Mount: Surface Mount,PCB; Case/Package: Radial; Contact Plating: Tin; Min Operating Temperature: -40°C; Max Operating Temperature: 85°C; Capacitance: 22uF; Tolerance: 20%; Voltage Rating: 6.3V; Packaging: Tape and Reel; Voltage Rating (DC): 6.3V; Package Quantity: 2000; Ripple Current (AC): 29mA; Ripple Current: 29mA; Termination: SMD/SMT; Voltage: 6.3V; Series: S; Construction: Cylindrical; Diameter: 4mm; Length: 5.5mm; Width: 4.3mm; Height: 5.4mm; Height - Seated (Max): 0.213inch; Lead Pitch: 1mm; Radiation Hardening: No; Lead Free: Lead Free; RoHS Compliant: Yes; REACH SVHC: No SVHC; ComponentLink1URL: https://datasheet.ciiva.com/11784/0900766b8078636e-11784644.pdf?src-supplier=RSComponents; ComponentLink1Description: https://datasheet.ciiva.com/11784/0900766b8078636e-11784644.pdf?src-supplier=RSComponents; ComponentLink2URL: https://datasheet.ciiva.com/24027/aba0000ce2-40801-24027015.pdf?src-supplier=Mouser; ComponentLink2Description: https://datasheet.ciiva.com/24027/aba0000ce2-40801-24027015.pdf?src-supplier=Mouser; ComponentLink3URL: https://datasheet.ciiva.com/14599/70255710-14599677.pdf?src-supplier=Allied+Electronics; ComponentLink3Description: https://datasheet.ciiva.com/14599/70255710-14599677.pdf?src-supplier=Allied+Electronics; ComponentLink4URL: https://datasheet.ciiva.com/6085/aba0000ce2-6085097.pdf?src-supplier=Farnell; ComponentLink4Description: https://datasheet.ciiva.com/6085/aba0000ce2-6085097.pdf?src-supplier=Farnell; ComponentLink5URL: https://datasheet.ciiva.com/46376/aba0000ce2-46376374.pdf?src-supplier=Element14; ComponentLink5Description: https://datasheet.ciiva.com/46376/aba0000ce2-46376374.pdf?src-supplier=Element14; ComponentLink6URL: https://datasheet.ciiva.com/2985/aba0000ce2-2985023.pdf?src-supplier=Avnet; ComponentLink6Description: https://datasheet.ciiva.com/2985/aba0000ce2-2985023.pdf?src-supplier=Avnet; ComponentLink7URL: https://datasheet.ciiva.com/16395/aba0000ce2-16395311.pdf?src-supplier=Future+Electronics; ComponentLink7Description: https://datasheet.ciiva.com/16395/aba0000ce2-16395311.pdf?src-supplier=Future+Electronics; ComponentLink8URL: https://datasheet.ciiva.com/17353/aba0000ce2-17353302.pdf?src-supplier=Avnet+Europe; ComponentLink8Description: https://datasheet.ciiva.com/17353/aba0000ce2-17353302.pdf?src-supplier=Avnet+Europe
footprint CAPACITOR/ALU - SIZE B/SMD - 4X5.4 (CAPACITOR  -  ALUMINIUM - SIZE B / EEEFK - SMD)
pins: 1, 2
text: +

## EEE-0JA221WP
designator EEE?  Supplier Part Number 1: EEE-0JA221WP
Cap Aluminum 220uF 6.3V 20% (6.3 X 5.4mm) SMD 74mA 1000h 85°C T/R; Manufacturer: Panasonic; Life (Hours): 1000Hour; Leakage Current: 3uA; Supplier 1: Arrow Electronics; Manufacturer Part Number: EEE-0JA221WP; RoHS: Yes; Category: Aluminum Electrolytic Capacitors; Stock 1: 3; Pricing 1: 1=0.19480 (USD); Mount: Surface Mount,PCB; Case/Package: Radial; Contact Plating: Tin; Min Operating Temperature: -40°C; Max Operating Temperature: 85°C; Packaging: Tape and Reel; Capacitance: 220uF; Tolerance: 20%; Ripple Current: 74mA; Voltage Rating (DC): 6.3V; Voltage Rating: 6.3V; Package Quantity: 1000; Ripple Current (AC): 74mA; Termination: SMD/SMT; Voltage: 6.3V; Series: S; Construction: Cylindrical; Diameter: 6.3mm; Length: 5.5mm; Height: 5.4mm; Height - Seated (Max): 0.213inch; Radiation Hardening: No; REACH SVHC: No SVHC; Lead Free: Lead Free; RoHS Compliant: Yes; ComponentLink1URL: https://datasheet.ciiva.com/43470/aba0000ce2-43470613.pdf?src-supplier=Farnell; ComponentLink1Description: https://datasheet.ciiva.com/43470/aba0000ce2-43470613.pdf?src-supplier=Farnell; ComponentLink2URL: https://datasheet.ciiva.com/31414/aba0000ce2-31414621.pdf?src-supplier=Farnell; ComponentLink2Description: https://datasheet.ciiva.com/31414/aba0000ce2-31414621.pdf?src-supplier=Farnell; ComponentLink3URL: https://datasheet.ciiva.com/46374/aba0000ce2-46374357.pdf?src-supplier=Element14; ComponentLink3Description: https://datasheet.ciiva.com/46374/aba0000ce2-46374357.pdf?src-supplier=Element14; ComponentLink4URL: https://datasheet.ciiva.com/24023/aba0000ce2-40801-24023941.pdf?src-supplier=Mouser; ComponentLink4Description: https://datasheet.ciiva.com/24023/aba0000ce2-40801-24023941.pdf?src-supplier=Mouser; ComponentLink5URL: https://datasheet.ciiva.com/14595/70255710-14595033.pdf?src-supplier=Allied+Electronics; ComponentLink5Description: https://datasheet.ciiva.com/14595/70255710-14595033.pdf?src-supplier=Allied+Electronics; ComponentLink6URL: https://datasheet.ciiva.com/2985/aba0000ce2-2985025.pdf?src-supplier=Avnet; ComponentLink6Description: https://datasheet.ciiva.com/2985/aba0000ce2-2985025.pdf?src-supplier=Avnet; ComponentLink7URL: https://datasheet.ciiva.com/16200/aba0000ce2-16200829.pdf?src-supplier=Future+Electronics; ComponentLink7Description: https://datasheet.ciiva.com/16200/aba0000ce2-16200829.pdf?src-supplier=Future+Electronics; ComponentLink8URL: https://datasheet.ciiva.com/30207/11aba0000ce2-30207866.pdf?src-supplier=Onlinecomponents.com; ComponentLink8Description: https://datasheet.ciiva.com/30207/11aba0000ce2-30207866.pdf?src-supplier=Onlinecomponents.com; ComponentLink9URL: https://datasheet.ciiva.com/15165/getdatasheetpartid-91778-15165883.pdf?src-supplier=Verical; ComponentLink9Description: https://datasheet.ciiva.com/15165/getdatasheetpartid-91778-15165883.pdf?src-supplier=Verical; ComponentLink10URL: https://datasheet.ciiva.com/17536/aba0000ce2-17536010.pdf?src-supplier=Avnet+Europe; ComponentLink10Description: https://datasheet.ciiva.com/17536/aba0000ce2-17536010.pdf?src-supplier=Avnet+Europe
footprint CAPACITOR/ALU - SIZE D/SMD - 6.3X5.4 (CAPACITOR  -  ALUMINIUM - SIZE D / EEEFK - SMD)
pins: 1, 2
text: +

## EEE-0JA330WR
designator EEE?  Supplier Part Number 1: PCE3859CT-ND
Cap Aluminum 33uF 6.3V 20% (4 X 5.4mm) SMD 22mA 1000 hr 85°C T/R; Manufacturer: Panasonic; Manufacturer Part Number: EEE-0JA330WR; Life (Hours): 1000Hour; Polarity: Polar; Leakage Current: 3uA; Supplier 1: Digi-Key; RoHS: Yes; Category: Aluminum Electrolytic Capacitors; Stock 1: 4504; Pricing 1: 1=0.36000, 10=0.25000, 50=0.16660, 100=0.14150, 500=0.09992, 1000=0.08742 (USD); Mount: Surface Mount,PCB; Case/Package: Radial; Min Operating Temperature: -40°C; Max Operating Temperature: 85°C; Capacitance: 33uF; Tolerance: 20%; Voltage Rating: 6.3V; Packaging: Tape and Reel; Package Quantity: 1; Voltage Rating (DC): 6.3V; Ripple Current: 22mA; Termination: SMD/SMT; Voltage: 6.3V; Ripple Current (AC): 22mA; Series: Automotive, AEC-Q200, S; Construction: Cylindrical; Diameter: 4mm; Length: 5.5mm; Height: 5.4mm; Height - Seated (Max): 0.213inch; Radiation Hardening: No; Lead Free: Lead Free; RoHS Compliant: Yes; REACH SVHC: No SVHC; ComponentLink1URL: https://datasheet.ciiva.com/30248/11aba0000ce2-30248293.pdf?src-supplier=Onlinecomponents.com; ComponentLink1Description: https://datasheet.ciiva.com/30248/11aba0000ce2-30248293.pdf?src-supplier=Onlinecomponents.com; ComponentLink2URL: https://datasheet.ciiva.com/11681/aba0000ce2-11681158.pdf?src-supplier=Avnet; ComponentLink2Description: https://datasheet.ciiva.com/11681/aba0000ce2-11681158.pdf?src-supplier=Avnet; ComponentLink3URL: https://datasheet.ciiva.com/43470/aba0000ce2-43470614.pdf?src-supplier=Farnell; ComponentLink3Description: https://datasheet.ciiva.com/43470/aba0000ce2-43470614.pdf?src-supplier=Farnell; ComponentLink4URL: https://datasheet.ciiva.com/14598/70255710-14598221.pdf?src-supplier=Allied+Electronics; ComponentLink4Description: https://datasheet.ciiva.com/14598/70255710-14598221.pdf?src-supplier=Allied+Electronics; ComponentLink5URL: https://datasheet.ciiva.com/31414/aba0000ce2-31414622.pdf?src-supplier=Farnell; ComponentLink5Description: https://datasheet.ciiva.com/31414/aba0000ce2-31414622.pdf?src-supplier=Farnell
footprint CAPACITOR/ALU - SIZE B/SMD - 4X5.4 (CAPACITOR  -  ALUMINIUM - SIZE B / EEEFK - SMD)
pins: 1, 2
text: +
